# Altium footprint library CONN_HDR_1.00MM_ST_SMD.PcbLib: 42 footprints (part 3 of 3)
Each footprint in its own frame and in the unit in brackets; x right, y up, seen from the top. Pads: shape width x height; smd on the part's side, far side on the other; paste and mask are expansions set on the pad; w line width, h text height; cw(c..) or ccw(c..) is an arc to the next point about the centre after c.
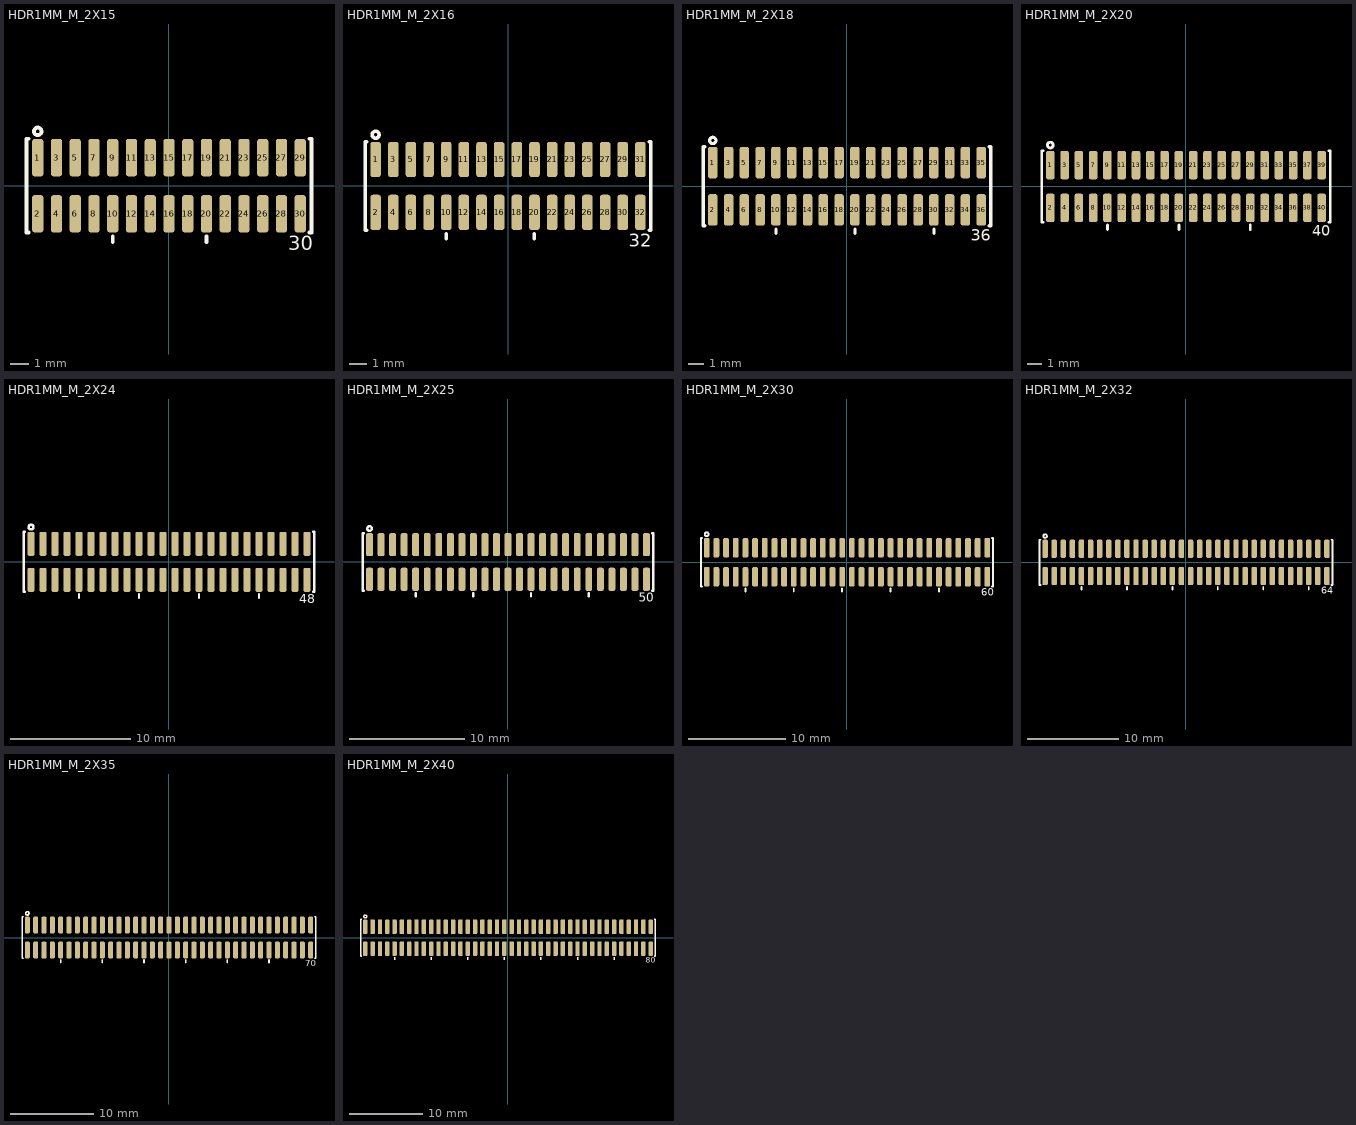
[diagram p2: the footprints below, top view; thin cyan lines are the x and y axes]

## HDR1MM_M_2X15 [mm] "HEADER, 1mm, SMD"
pads (30):
  rrect50% 0.6x2 smd mask+0.075: 1(-7,1.5) 2(-7,-1.5) 3(-6,1.5) 4(-6,-1.5) 5(-5,1.5) 6(-5,-1.5) 7(-4,1.5) 8(-4,-1.5) 9(-3,1.5) 10(-3,-1.5) 11(-2,1.5) 12(-2,-1.5) 13(-1,1.5) 14(-1,-1.5) 15(0,1.5) 16(0,-1.5) 17(1,1.5) 18(1,-1.5) 19(2,1.5) 20(2,-1.5) 21(3,1.5) 22(3,-1.5) 23(4,1.5) 24(4,-1.5) 25(5,1.5) 26(5,-1.5) 27(6,1.5) 28(6,-1.5) 29(7,1.5) 30(7,-1.5)
Top Overlay:
  circle w0.2: c-7,2.9 r0.2
  lines w0.2: -7.5,-2.5 -7.6,-2.5 -7.6,2.5 -7.5,2.5 ; -3,-3 -3,-2.7 ; 2,-3 2,-2.7 ; 7.5,-2.5 7.6,-2.5 7.6,2.5 7.5,2.5
  text "30" at 6.35,-3.45 h0.75
3D body "BC050-30A-K0-0200-0160-0480-LB.stp": height 3.6, standoff 0, extent -7.5,-2.4 7.5,2.4

## HDR1MM_M_2X16 [mm] "HEADER, 1mm, SMD"
pads (32):
  rrect50% 0.6x2 smd mask+0.075: 1(-7.5,1.5) 2(-7.5,-1.5) 3(-6.5,1.5) 4(-6.5,-1.5) 5(-5.5,1.5) 6(-5.5,-1.5) 7(-4.5,1.5) 8(-4.5,-1.5) 9(-3.5,1.5) 10(-3.5,-1.5) 11(-2.5,1.5) 12(-2.5,-1.5) 13(-1.5,1.5) 14(-1.5,-1.5) 15(-0.5,1.5) 16(-0.5,-1.5) 17(0.5,1.5) 18(0.5,-1.5) 19(1.5,1.5) 20(1.5,-1.5) 21(2.5,1.5) 22(2.5,-1.5) 23(3.5,1.5) 24(3.5,-1.5) 25(4.5,1.5) 26(4.5,-1.5) 27(5.5,1.5) 28(5.5,-1.5) 29(6.5,1.5) 30(6.5,-1.5) 31(7.5,1.5) 32(7.5,-1.5)
Top Overlay:
  circle w0.2: c-7.5,2.9 r0.2
  lines w0.2: -8,-2.5 -8.1,-2.5 -8.1,2.5 -8,2.5 ; -3.5,-3 -3.5,-2.7 ; 1.5,-3 1.5,-2.7 ; 8,-2.5 8.1,-2.5 8.1,2.5 8,2.5
  text "32" at 6.85,-3.45 h0.75
3D body "BC050-32A-K0-0200-0160-0480-LB.stp": height 3.6, standoff 0, extent -8,-2.4 8,2.4

## HDR1MM_M_2X18 [mm] "HEADER, 1mm, SMD"
pads (36):
  rrect50% 0.6x2 smd mask+0.075: 1(-8.5,1.5) 2(-8.5,-1.5) 3(-7.5,1.5) 4(-7.5,-1.5) 5(-6.5,1.5) 6(-6.5,-1.5) 7(-5.5,1.5) 8(-5.5,-1.5) 9(-4.5,1.5) 10(-4.5,-1.5) 11(-3.5,1.5) 12(-3.5,-1.5) 13(-2.5,1.5) 14(-2.5,-1.5) 15(-1.5,1.5) 16(-1.5,-1.5) 17(-0.5,1.5) 18(-0.5,-1.5) 19(0.5,1.5) 20(0.5,-1.5) 21(1.5,1.5) 22(1.5,-1.5) 23(2.5,1.5) 24(2.5,-1.5) 25(3.5,1.5) 26(3.5,-1.5) 27(4.5,1.5) 28(4.5,-1.5) 29(5.5,1.5) 30(5.5,-1.5) 31(6.5,1.5) 32(6.5,-1.5) 33(7.5,1.5) 34(7.5,-1.5) 35(8.5,1.5) 36(8.5,-1.5)
Top Overlay:
  circle w0.2: c-8.5,2.9 r0.2
  lines w0.2: -9,-2.5 -9.1,-2.5 -9.1,2.5 -9,2.5 ; -4.5,-3 -4.5,-2.7 ; 0.5,-3 0.5,-2.7 ; 5.5,-3 5.5,-2.7 ; 9,-2.5 9.1,-2.5 9.1,2.5 9,2.5
  text "36" at 7.85,-3.45 h0.75
3D body "BC050-36A-K0-0200-0160-0480-LB.stp": height 3.6, standoff 0, extent -9,-2.4 9,2.4

## HDR1MM_M_2X20 [mm] "HEADER, 1mm, SMD"
pads (40):
  rrect50% 0.6x2 smd mask+0.075: 1(-9.5,1.5) 2(-9.5,-1.5) 3(-8.5,1.5) 4(-8.5,-1.5) 5(-7.5,1.5) 6(-7.5,-1.5) 7(-6.5,1.5) 8(-6.5,-1.5) 9(-5.5,1.5) 10(-5.5,-1.5) 11(-4.5,1.5) 12(-4.5,-1.5) 13(-3.5,1.5) 14(-3.5,-1.5) 15(-2.5,1.5) 16(-2.5,-1.5) 17(-1.5,1.5) 18(-1.5,-1.5) 19(-0.5,1.5) 20(-0.5,-1.5) 21(0.5,1.5) 22(0.5,-1.5) 23(1.5,1.5) 24(1.5,-1.5) 25(2.5,1.5) 26(2.5,-1.5) 27(3.5,1.5) 28(3.5,-1.5) 29(4.5,1.5) 30(4.5,-1.5) 31(5.5,1.5) 32(5.5,-1.5) 33(6.5,1.5) 34(6.5,-1.5) 35(7.5,1.5) 36(7.5,-1.5) 37(8.5,1.5) 38(8.5,-1.5) 39(9.5,1.5) 40(9.5,-1.5)
Top Overlay:
  circle w0.2: c-9.5,2.9 r0.2
  lines w0.2: -10,-2.5 -10.1,-2.5 -10.1,2.5 -10,2.5 ; -5.5,-3 -5.5,-2.7 ; -0.5,-3 -0.5,-2.7 ; 4.5,-3 4.5,-2.7 ; 10,-2.5 10.1,-2.5 10.1,2.5 10,2.5
  text "40" at 8.85,-3.45 h0.75
3D body "BC050-40A-K0-0200-0160-0480-LB.stp": height 3.6, standoff 0, extent -10,-2.4 10,2.4

## HDR1MM_M_2X24 [mm] "HEADER, 1mm, SMD"
pads (48):
  rrect50% 0.6x2 smd mask+0.075: 1(-11.5,1.5) 2(-11.5,-1.5) 3(-10.5,1.5) 4(-10.5,-1.5) 5(-9.5,1.5) 6(-9.5,-1.5) 7(-8.5,1.5) 8(-8.5,-1.5) 9(-7.5,1.5) 10(-7.5,-1.5) 11(-6.5,1.5) 12(-6.5,-1.5) 13(-5.5,1.5) 14(-5.5,-1.5) 15(-4.5,1.5) 16(-4.5,-1.5) 17(-3.5,1.5) 18(-3.5,-1.5) 19(-2.5,1.5) 20(-2.5,-1.5) 21(-1.5,1.5) 22(-1.5,-1.5) 23(-0.5,1.5) 24(-0.5,-1.5) 25(0.5,1.5) 26(0.5,-1.5) 27(1.5,1.5) 28(1.5,-1.5) 29(2.5,1.5) 30(2.5,-1.5) 31(3.5,1.5) 32(3.5,-1.5) 33(4.5,1.5) 34(4.5,-1.5) 35(5.5,1.5) 36(5.5,-1.5) 37(6.5,1.5) 38(6.5,-1.5) 39(7.5,1.5) 40(7.5,-1.5) 41(8.5,1.5) 42(8.5,-1.5) 43(9.5,1.5) 44(9.5,-1.5) 45(10.5,1.5) 46(10.5,-1.5) 47(11.5,1.5) 48(11.5,-1.5)
Top Overlay:
  circle w0.2: c-11.5,2.9 r0.2
  lines w0.2: -12,-2.5 -12.1,-2.5 -12.1,2.5 -12,2.5 ; -7.5,-3 -7.5,-2.7 ; -2.5,-3 -2.5,-2.7 ; 2.5,-3 2.5,-2.7 ; 7.5,-3 7.5,-2.7 ; 12,-2.5 12.1,-2.5 12.1,2.5 12,2.5
  text "48" at 10.85,-3.45 h0.75
3D body "BC050-48A-K0-0200-0160-0480-LB.stp": height 3.6, standoff 0, extent -12,-2.4 12,2.4

## HDR1MM_M_2X25 [mm] "HEADER, 1mm, SMD"
pads (50):
  rrect50% 0.6x2 smd mask+0.075: 1(-12,1.5) 2(-12,-1.5) 3(-11,1.5) 4(-11,-1.5) 5(-10,1.5) 6(-10,-1.5) 7(-9,1.5) 8(-9,-1.5) 9(-8,1.5) 10(-8,-1.5) 11(-7,1.5) 12(-7,-1.5) 13(-6,1.5) 14(-6,-1.5) 15(-5,1.5) 16(-5,-1.5) 17(-4,1.5) 18(-4,-1.5) 19(-3,1.5) 20(-3,-1.5) 21(-2,1.5) 22(-2,-1.5) 23(-1,1.5) 24(-1,-1.5) 25(0,1.5) 26(0,-1.5) 27(1,1.5) 28(1,-1.5) 29(2,1.5) 30(2,-1.5) 31(3,1.5) 32(3,-1.5) 33(4,1.5) 34(4,-1.5) 35(5,1.5) 36(5,-1.5) 37(6,1.5) 38(6,-1.5) 39(7,1.5) 40(7,-1.5) 41(8,1.5) 42(8,-1.5) 43(9,1.5) 44(9,-1.5) 45(10,1.5) 46(10,-1.5) 47(11,1.5) 48(11,-1.5) 49(12,1.5) 50(12,-1.5)
Top Overlay:
  circle w0.2: c-12,2.9 r0.2
  lines w0.2: -12.5,-2.5 -12.6,-2.5 -12.6,2.5 -12.5,2.5 ; -8,-3 -8,-2.7 ; -3,-3 -3,-2.7 ; 2,-3 2,-2.7 ; 7,-3 7,-2.7 ; 12.5,-2.5 12.6,-2.5 12.6,2.5 12.5,2.5
  text "50" at 11.35,-3.45 h0.75
3D body "BC050-50A-K0-0200-0160-0480-LB.stp": height 3.6, standoff 0, extent -12.5,-2.4 12.5,2.4

## HDR1MM_M_2X30 [mm] "HEADER, 1mm, SMD"
pads (60):
  rrect50% 0.6x2 smd mask+0.075: 1(-14.5,1.5) 2(-14.5,-1.5) 3(-13.5,1.5) 4(-13.5,-1.5) 5(-12.5,1.5) 6(-12.5,-1.5) 7(-11.5,1.5) 8(-11.5,-1.5) 9(-10.5,1.5) 10(-10.5,-1.5) 11(-9.5,1.5) 12(-9.5,-1.5) 13(-8.5,1.5) 14(-8.5,-1.5) 15(-7.5,1.5) 16(-7.5,-1.5) 17(-6.5,1.5) 18(-6.5,-1.5) 19(-5.5,1.5) 20(-5.5,-1.5) 21(-4.5,1.5) 22(-4.5,-1.5) 23(-3.5,1.5) 24(-3.5,-1.5) 25(-2.5,1.5) 26(-2.5,-1.5) 27(-1.5,1.5) 28(-1.5,-1.5) 29(-0.5,1.5) 30(-0.5,-1.5) 31(0.5,1.5) 32(0.5,-1.5) 33(1.5,1.5) 34(1.5,-1.5) 35(2.5,1.5) 36(2.5,-1.5) 37(3.5,1.5) 38(3.5,-1.5) 39(4.5,1.5) 40(4.5,-1.5) 41(5.5,1.5) 42(5.5,-1.5) 43(6.5,1.5) 44(6.5,-1.5) 45(7.5,1.5) 46(7.5,-1.5) 47(8.5,1.5) 48(8.5,-1.5) 49(9.5,1.5) 50(9.5,-1.5) 51(10.5,1.5) 52(10.5,-1.5) 53(11.5,1.5) 54(11.5,-1.5) 55(12.5,1.5) 56(12.5,-1.5) 57(13.5,1.5) 58(13.5,-1.5) 59(14.5,1.5) 60(14.5,-1.5)
Top Overlay:
  circle w0.2: c-14.5,2.9 r0.2
  lines w0.2: -15,-2.5 -15.1,-2.5 -15.1,2.5 -15,2.5 ; -10.5,-3 -10.5,-2.7 ; -5.5,-3 -5.5,-2.7 ; -0.5,-3 -0.5,-2.7 ; 4.5,-3 4.5,-2.7 ; 9.5,-3 9.5,-2.7 ; 15,-2.5 15.1,-2.5 15.1,2.5 15,2.5
  text "60" at 13.85,-3.45 h0.75
3D body "BC050-60A-K0-0200-0160-0480-LB.stp": height 3.6, standoff 0, extent -15,-2.4 15,2.4

## HDR1MM_M_2X32 [mm] "HEADER, 1mm, SMD"
pads (64):
  rrect50% 0.6x2 smd mask+0.075: 1(-15.5,1.5) 2(-15.5,-1.5) 3(-14.5,1.5) 4(-14.5,-1.5) 5(-13.5,1.5) 6(-13.5,-1.5) 7(-12.5,1.5) 8(-12.5,-1.5) 9(-11.5,1.5) 10(-11.5,-1.5) 11(-10.5,1.5) 12(-10.5,-1.5) 13(-9.5,1.5) 14(-9.5,-1.5) 15(-8.5,1.5) 16(-8.5,-1.5) 17(-7.5,1.5) 18(-7.5,-1.5) 19(-6.5,1.5) 20(-6.5,-1.5) 21(-5.5,1.5) 22(-5.5,-1.5) 23(-4.5,1.5) 24(-4.5,-1.5) 25(-3.5,1.5) 26(-3.5,-1.5) 27(-2.5,1.5) 28(-2.5,-1.5) 29(-1.5,1.5) 30(-1.5,-1.5) 31(-0.5,1.5) 32(-0.5,-1.5) 33(0.5,1.5) 34(0.5,-1.5) 35(1.5,1.5) 36(1.5,-1.5) 37(2.5,1.5) 38(2.5,-1.5) 39(3.5,1.5) 40(3.5,-1.5) 41(4.5,1.5) 42(4.5,-1.5) 43(5.5,1.5) 44(5.5,-1.5) 45(6.5,1.5) 46(6.5,-1.5) 47(7.5,1.5) 48(7.5,-1.5) 49(8.5,1.5) 50(8.5,-1.5) 51(9.5,1.5) 52(9.5,-1.5) 53(10.5,1.5) 54(10.5,-1.5) 55(11.5,1.5) 56(11.5,-1.5) 57(12.5,1.5) 58(12.5,-1.5) 59(13.5,1.5) 60(13.5,-1.5) 61(14.5,1.5) 62(14.5,-1.5) 63(15.5,1.5) 64(15.5,-1.5)
Top Overlay:
  circle w0.2: c-15.5,2.9 r0.2
  lines w0.2: -16,-2.5 -16.1,-2.5 -16.1,2.5 -16,2.5 ; -11.5,-3 -11.5,-2.7 ; -6.5,-3 -6.5,-2.7 ; -1.5,-3 -1.5,-2.7 ; 3.5,-3 3.5,-2.7 ; 8.5,-3 8.5,-2.7 ; 13.5,-3 13.5,-2.7 ; 16,-2.5 16.1,-2.5 16.1,2.5 16,2.5
  text "64" at 14.85,-3.45 h0.75
3D body "BC050-64A-K0-0200-0160-0480-LB.stp": height 3.6, standoff 0, extent -16,-2.4 16,2.4

## HDR1MM_M_2X35 [mm] "HEADER, 1mm, SMD"
pads (70):
  rrect50% 0.6x2 smd mask+0.075: 1(-17,1.5) 2(-17,-1.5) 3(-16,1.5) 4(-16,-1.5) 5(-15,1.5) 6(-15,-1.5) 7(-14,1.5) 8(-14,-1.5) 9(-13,1.5) 10(-13,-1.5) 11(-12,1.5) 12(-12,-1.5) 13(-11,1.5) 14(-11,-1.5) 15(-10,1.5) 16(-10,-1.5) 17(-9,1.5) 18(-9,-1.5) 19(-8,1.5) 20(-8,-1.5) 21(-7,1.5) 22(-7,-1.5) 23(-6,1.5) 24(-6,-1.5) 25(-5,1.5) 26(-5,-1.5) 27(-4,1.5) 28(-4,-1.5) 29(-3,1.5) 30(-3,-1.5) 31(-2,1.5) 32(-2,-1.5) 33(-1,1.5) 34(-1,-1.5) 35(0,1.5) 36(0,-1.5) 37(1,1.5) 38(1,-1.5) 39(2,1.5) 40(2,-1.5) 41(3,1.5) 42(3,-1.5) 43(4,1.5) 44(4,-1.5) 45(5,1.5) 46(5,-1.5) 47(6,1.5) 48(6,-1.5) 49(7,1.5) 50(7,-1.5) 51(8,1.5) 52(8,-1.5) 53(9,1.5) 54(9,-1.5) 55(10,1.5) 56(10,-1.5) 57(11,1.5) 58(11,-1.5) 59(12,1.5) 60(12,-1.5) 61(13,1.5) 62(13,-1.5) 63(14,1.5) 64(14,-1.5) 65(15,1.5) 66(15,-1.5) 67(16,1.5) 68(16,-1.5) 69(17,1.5) 70(17,-1.5)
Top Overlay:
  circle w0.2: c-17,2.9 r0.2
  lines w0.2: -17.5,-2.5 -17.6,-2.5 -17.6,2.5 -17.5,2.5 ; -13,-3 -13,-2.7 ; -8,-3 -8,-2.7 ; -3,-3 -3,-2.7 ; 2,-3 2,-2.7 ; 7,-3 7,-2.7 ; 12,-3 12,-2.7 ; 17.5,-2.5 17.6,-2.5 17.6,2.5 17.5,2.5
  text "70" at 16.35,-3.45 h0.75
3D body "BC050-70A-K0-0200-0160-0480-LB.stp": height 3.6, standoff 0, extent -17.5,-2.4 17.5,2.4

## HDR1MM_M_2X40 [mm] "HEADER, 1mm, SMD"
pads (80):
  rrect50% 0.6x2 smd mask+0.075: 1(-19.5,1.5) 2(-19.5,-1.5) 3(-18.5,1.5) 4(-18.5,-1.5) 5(-17.5,1.5) 6(-17.5,-1.5) 7(-16.5,1.5) 8(-16.5,-1.5) 9(-15.5,1.5) 10(-15.5,-1.5) 11(-14.5,1.5) 12(-14.5,-1.5) 13(-13.5,1.5) 14(-13.5,-1.5) 15(-12.5,1.5) 16(-12.5,-1.5) 17(-11.5,1.5) 18(-11.5,-1.5) 19(-10.5,1.5) 20(-10.5,-1.5) 21(-9.5,1.5) 22(-9.5,-1.5) 23(-8.5,1.5) 24(-8.5,-1.5) 25(-7.5,1.5) 26(-7.5,-1.5) 27(-6.5,1.5) 28(-6.5,-1.5) 29(-5.5,1.5) 30(-5.5,-1.5) 31(-4.5,1.5) 32(-4.5,-1.5) 33(-3.5,1.5) 34(-3.5,-1.5) 35(-2.5,1.5) 36(-2.5,-1.5) 37(-1.5,1.5) 38(-1.5,-1.5) 39(-0.5,1.5) 40(-0.5,-1.5) 41(0.5,1.5) 42(0.5,-1.5) 43(1.5,1.5) 44(1.5,-1.5) 45(2.5,1.5) 46(2.5,-1.5) 47(3.5,1.5) 48(3.5,-1.5) 49(4.5,1.5) 50(4.5,-1.5) 51(5.5,1.5) 52(5.5,-1.5) 53(6.5,1.5) 54(6.5,-1.5) 55(7.5,1.5) 56(7.5,-1.5) 57(8.5,1.5) 58(8.5,-1.5) 59(9.5,1.5) 60(9.5,-1.5) 61(10.5,1.5) 62(10.5,-1.5) 63(11.5,1.5) 64(11.5,-1.5) 65(12.5,1.5) 66(12.5,-1.5) 67(13.5,1.5) 68(13.5,-1.5) 69(14.5,1.5) 70(14.5,-1.5) 71(15.5,1.5) 72(15.5,-1.5) 73(16.5,1.5) 74(16.5,-1.5) 75(17.5,1.5) 76(17.5,-1.5) 77(18.5,1.5) 78(18.5,-1.5) 79(19.5,1.5) 80(19.5,-1.5)
Top Overlay:
  circle w0.2: c-19.5,2.9 r0.2
  lines w0.2: -20,-2.5 -20.1,-2.5 -20.1,2.5 -20,2.5 ; -15.5,-3 -15.5,-2.7 ; -10.5,-3 -10.5,-2.7 ; -5.5,-3 -5.5,-2.7 ; -0.5,-3 -0.5,-2.7 ; 4.5,-3 4.5,-2.7 ; 9.5,-3 9.5,-2.7 ; 14.5,-3 14.5,-2.7 ; 20,-2.5 20.1,-2.5 20.1,2.5 20,2.5
  text "80" at 18.85,-3.45 h0.75
3D body "BC050-80A-K0-0200-0160-0480-LB.stp": height 3.6, standoff 0, extent -20,-2.4 20,2.4